# Altium footprint library 晶体管封装库.PcbLib: 101 footprints (part 4 of 7)
Each footprint in its own frame and in the unit in brackets; x right, y up, seen from the top. Pads: shape width x height; smd on the part's side, far side on the other; paste and mask are expansions set on the pad; w line width, h text height; cw(c..) or ccw(c..) is an arc to the next point about the centre after c.
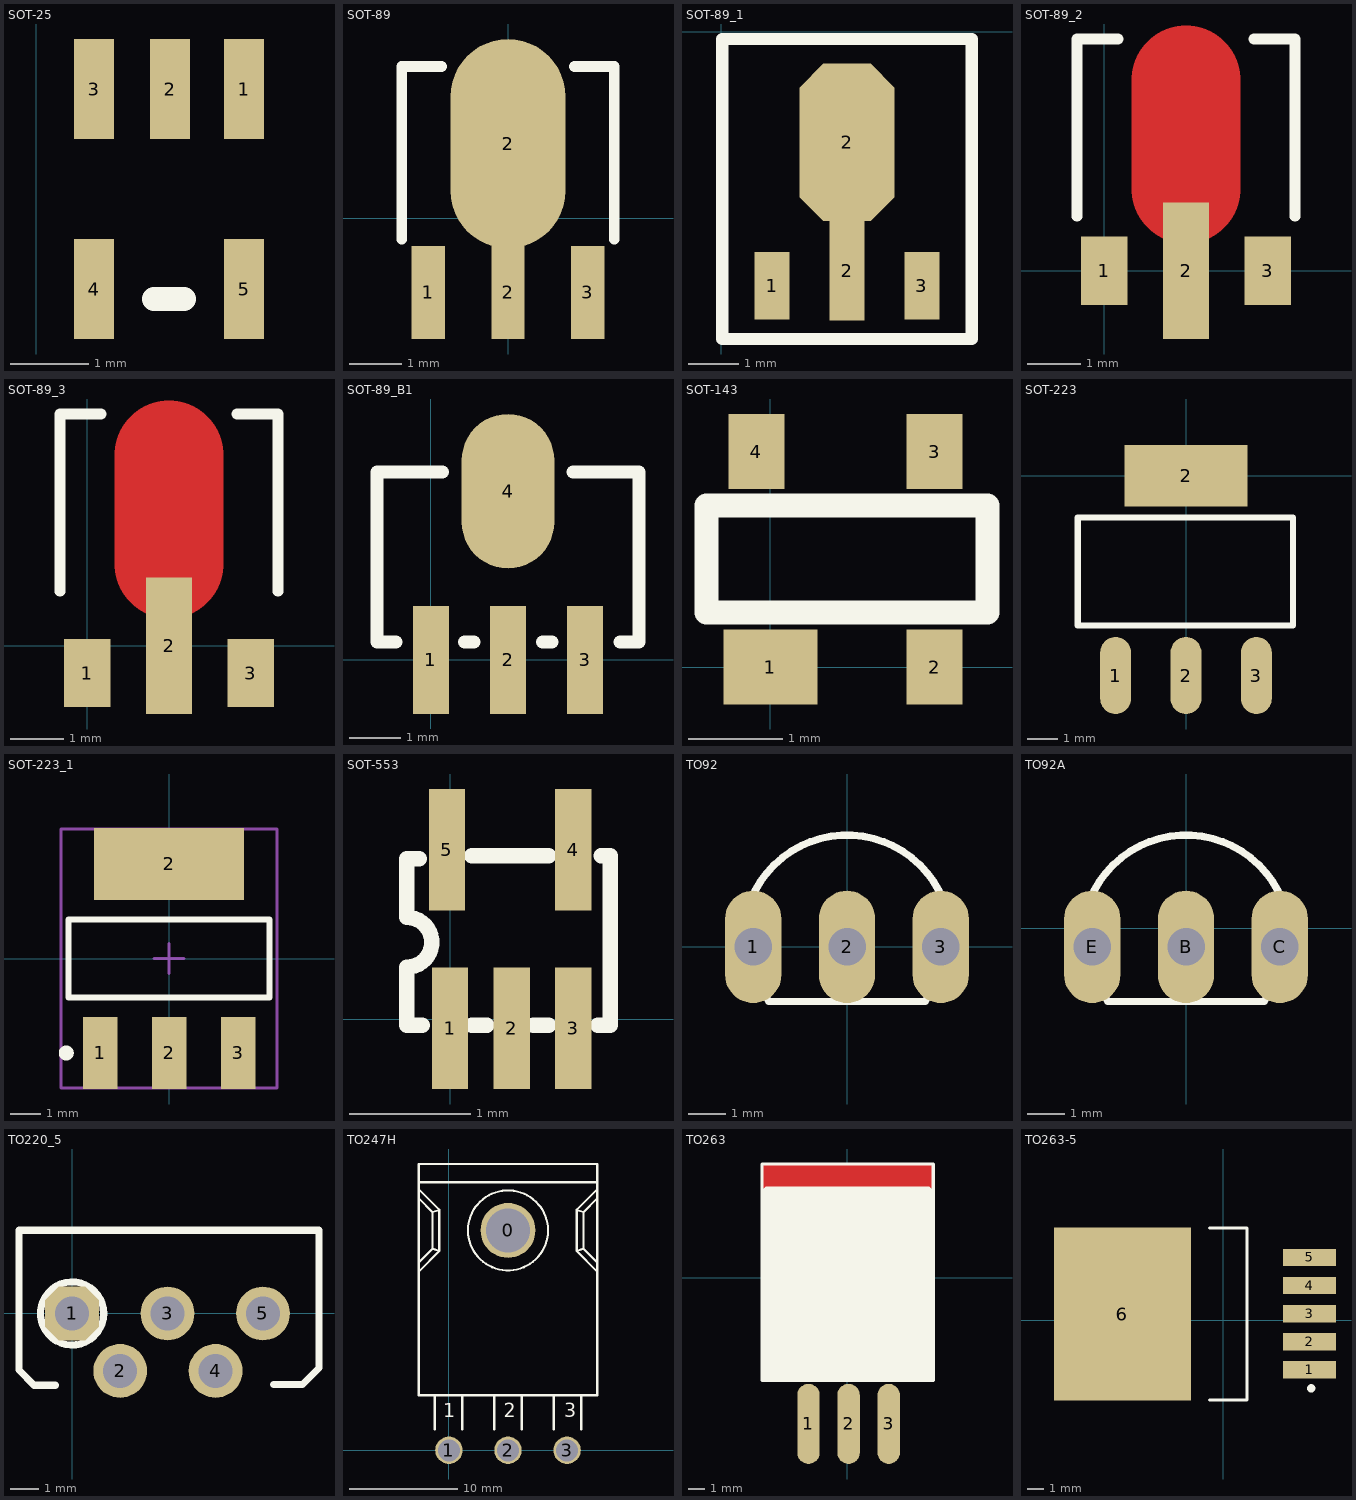
[diagram p3: the footprints below, top view; thin cyan lines are the x and y axes]

## SOT-25 [mil]
pads (5):
  rect 20x50 smd: 1(104,-40) 2(67,-40) 3(29,-40) 4(29,-140) 5(104,-140)
Top Overlay:
  lines w12: 59,-145 74,-145

## SOT-89 [mil]
pads (4):
  rect 25x70 smd: 1(-60,-56) 2(0,-56) 3(60,-56)
  oval 86.61x157.48 smd: 2(0,56)
Top Overlay:
  lines w8: -80,-16 -80,114 -50,114 ; 50,114 80,114 80,-16
3D body: height 61.23, standoff 0.6, extent -89.16,-68 88,99.32

## SOT-89_1 [mm]
pads (4):
  rect 0.7x1.35 smd: 1(1.016,-5.08) 3(4.016,-5.08)
  rect 0.7x1.99 smd: 2(2.516,-4.785)
  oct 1.9x3.15 smd: 2(2.516,-2.215)
Top Overlay:
  lines w0.25: 0.016,-6.148 0.016,-0.147 5.016,-0.147 5.016,-6.148 0.016,-6.148

## SOT-89_2 [mil]
pads (3):
  rect 34x50 smd: 1(0,0) 3(120,0)
  rect 34x100 smd: 2(60,0)
Top Layer:
  lines w80: 60,60 60,140
Top Overlay:
  lines w8: -20,40 -20,170 10,170 ; 110,170 140,170 140,40

## SOT-89_3 [mil]
pads (3):
  rect 34x50 smd: 1(0,-20) 3(120,-20)
  rect 34x100 smd: 2(60,0)
Top Layer:
  lines w80: 60,60 60,140
Top Overlay:
  lines w8: -20,40 -20,170 10,170 ; 110,170 140,170 140,40
Top Solder:
  lines w80: 60,60 60,140
3D body: height 55.12, standoff 0, extent -30,-30 147.17,124.92

## SOT-89_B1 [mm]
pads (4):
  rect 0.7x2.1 smd: 1(0,0) 2(1.5,0) 3(3,0)
  oval 1.8x3 smd: 4(1.5,3.281)
Top Overlay:
  lines w0.254: -0.68,0.35 -1.05,0.35 -1.05,3.65 0.23,3.65 ; 0.66,0.35 0.84,0.35 ; 2.17,0.35 2.35,0.35 ; 2.76,3.65 4.05,3.65 4.05,0.35 3.68,0.35

## SOT-143 [mm]
pads (4):
  rect 1x0.8 smd: 1(0,0)
  rect 0.6x0.8 smd: 2(1.75,0) 3(1.75,2.3) 4(-0.15,2.3)
Top Overlay:
  lines w0.254: -0.683,0.583 2.317,0.583 2.317,1.726 -0.683,1.726 -0.683,0.583
3D body: height 1, standoff 0, extent -0.66,-0.06 2.26,2.36

## SOT-223 [mm]
pads (4):
  oval 1x2.5 smd: 1(-2.29,-6.5) 2(0,-6.5) 3(2.29,-6.5)
  rect 4x2 smd: 2(0,0)
Top Overlay:
  lines w0.2: -3.519,-4.869 -3.519,-1.369 3.481,-1.369 3.481,-4.869 -3.519,-4.869
3D body: height 1.68, standoff 0, extent -3.25,-6.782 3.25,0.178

## SOT-223_1 [mm]
pads (4):
  rect 1.15x2.4 smd: 1(-2.3,-3.15) 2(0,-3.15) 3(2.3,-3.15)
  rect 5x2.4 smd: 2(0,3.15)
Top Overlay:
  circle w0.25: c-3.425,-3.15 r0.125
  lines w0.2: -3.35,-1.3 -3.35,1.3 3.35,1.3 3.35,-1.3 -3.35,-1.3
Mechanical 15:
  lines w0.1: -0.5,0 0.5,0 ; 0,-0.5 0,0.5 ; -3.6,-4.325 -3.6,4.325 3.6,4.325 3.6,-4.325 -3.6,-4.325
3D body: height 2.66, standoff 0.02, extent -3.408,-3.448 3.302,3.702

## SOT-553 [mm]
pads (5):
  rect 0.3x1 smd: 1(0,-0.076) 2(0.508,-0.076) 3(1.016,-0.076) 4(1.016,1.397) 5(-0.025,1.397)
Top Overlay:
  lines w0.127: -0.254,1.321 -0.356,1.321 -0.356,0.838 cw(c-0.356,0.633) -0.356,0.429 -0.356,-0.051 -0.229,-0.051 ; 0.178,-0.051 0.305,-0.051 ; 0.178,1.346 0.813,1.346 ; 0.686,-0.051 0.813,-0.051 ; 1.219,-0.051 1.321,-0.051 1.321,1.346 1.245,1.346

## TO92 [mil]
pads (3):
  oval 60x120 hole 40: 1(-100,0) 2(0,0) 3(100,0)
Top Overlay:
  lines w7.87: -102.76,49.85 cw(c0,8.33) 102.76,49.85 ; -89.08,-49.71 -83.33,-58.33 83.33,-58.33 89.08,-49.71

## TO92A [mil]
pads (3):
  oval 60x120 hole 40: B(0,-20) C(100,-20) E(-100,-20)
Top Overlay:
  lines w7.87: -102.76,29.85 cw(c0,-11.67) 102.76,29.85 ; -89.08,-69.71 -83.33,-78.33 83.33,-78.33 89.08,-69.71

## TO220_5 [mm]
pads (5):
  oct 1.905x1.905 hole 1.2: 1(0,0)
  round 1.905 hole 1.2: 2(1.702,-2.032) 3(3.378,0) 4(5.08,-2.032) 5(6.756,0)
Top Overlay:
  circle w0.254: c0,0 r1.118
  lines w0.254: -0.584,-2.54 -1.346,-2.54 -1.88,-2.006 -1.88,1.34 -1.88,2.946 8.74,2.946 8.74,1.432 8.74,-1.928 8.151,-2.517 7.135,-2.517
3D body: height 19.35, standoff -2.26, extent -1.68,-2.1 8.48,2.8

## TO247H [mil]
pads (4):
  round 200 hole 160: 0(215,800)
  round 100 hole 80: 1(0,0) 2(215,0) 3(430,0)
Top Overlay:
  circle w7.87: c215,800 r145.6
  lines w7.87: -110,650 -35,725 ; -110,683.33 -60,733.33 ; -110,916.67 -60,866.67 ; -110,950 -35,875 ; -110,975 540,975 ; -51.67,75 -51.67,200 ; 48.33,75 48.33,200 ; 165,75 165,200 ; 265,75 265,200 ; 381.67,75 381.67,200 ; 481.67,75 481.67,200 ; 540,650 465,725 ; 540,683.33 490,733.33 ; 540,916.67 490,866.67 ; 540,950 465,875 ; -60,733.33 -35,725 ; -60,733.33 -60,866.67 ; -60,866.67 -35,875 ; -35,725 -35,875 ; 465,725 490,733.33 ; 465,725 465,875 ; 465,875 490,866.67 ; 490,733.33 490,866.67 ; -110,200 -110,1041.67 540,1041.67 540,200 -110,200
  text "3" at 420,120 h50
  text "2" at 200,120 h50
  text "1" at -20,120 h50
3D body: height 153.54, standoff -314.96, extent -90,0 520.24,1000

## TO263 [mm]
height 1.99
pads (3):
  oval 1.4x5 smd: 1(-2.43,-9.12) 2(0.07,-9.12) 3(2.57,-9.12)
Top Layer:
  rectangle: -5.33,3.88 5.37,7.08
Top Overlay:
  rectangle: -5.33,-6.42 5.34,5.38
  lines w0.2: -5.33,3.68 5.24,3.68 ; -5.33,4.98 -5.33,4.78 -5.33,5.31 -5.06,5.58 -4.46,5.58 4.94,5.58 ; -5.33,5.18 -4.93,5.58 -4.86,5.58 ; -5.096,5.414 5.106,5.414 ; 4.47,5.58 5.07,5.58 5.34,5.31 5.34,4.78 ; 4.87,5.58 4.94,5.58 ; 5.34,5.18 4.94,5.58 ; -5.33,-6.42 5.34,-6.42 5.34,7.08 -5.33,7.08 -5.33,-6.42
Top Solder:
  rectangle: -5.43,4.377 5.37,7.077

## TO263-5 [mm]
pads (6):
  rect 3.2x1.05 smd: 1(5.207,-2.997) 2(5.207,-1.297) 3(5.207,0.403) 4(5.207,2.103) 5(5.207,3.803)
  rect 8.3x10.45 smd: 6(-6.117,0.381)
Top Overlay:
  circle w0.25: c5.309,-4.115 r0.125
  lines w0.2: -0.83,-4.819 1.42,-4.819 1.42,5.581 -0.83,5.581
3D body: height 4.78, standoff -0.02, extent -9.537,-4.644 6.133,5.356